# Altium footprint library General.PcbLib: 246 footprints (part 14 of 16)
Each footprint in its own frame and in the unit in brackets; x right, y up, seen from the top. Pads: shape width x height; smd on the part's side, far side on the other; paste and mask are expansions set on the pad; w line width, h text height; cw(c..) or ccw(c..) is an arc to the next point about the centre after c.
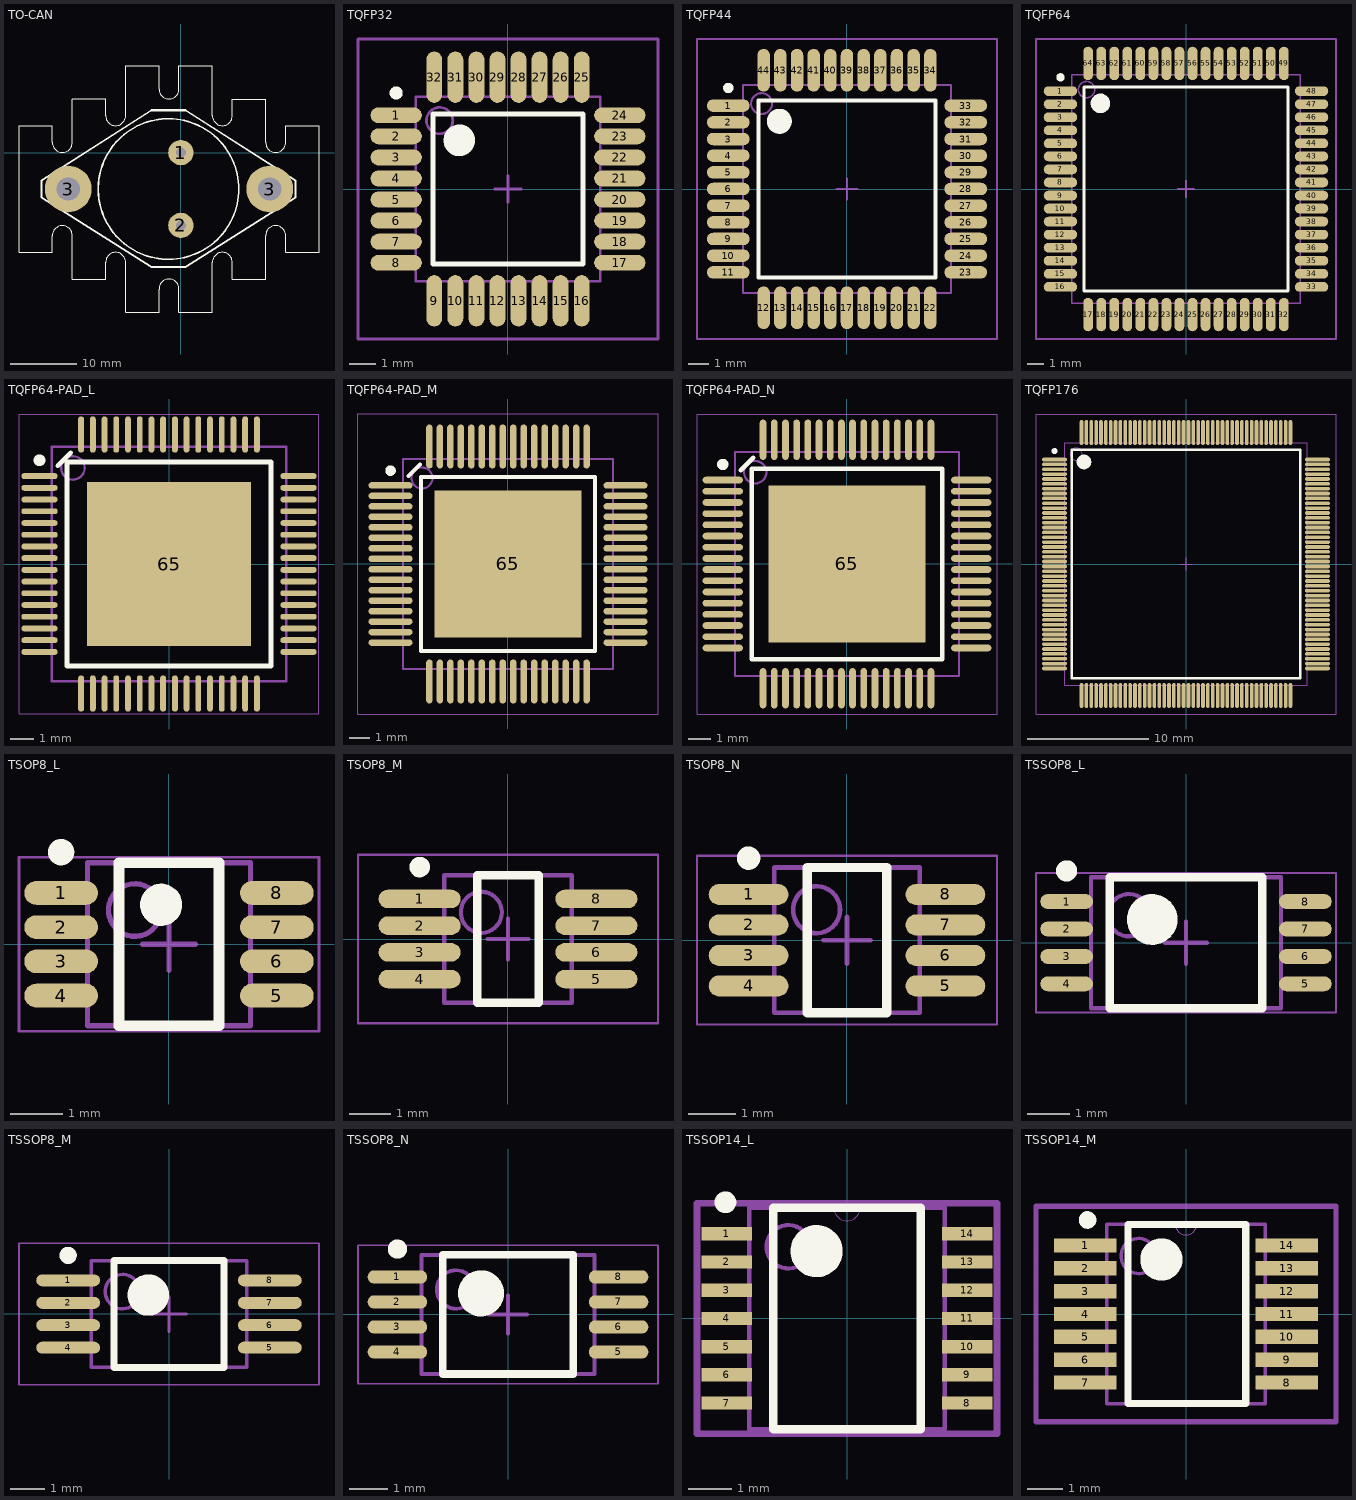
[diagram p13: the footprints below, top view; thin cyan lines are the x and y axes]

## TO-CAN [mm]
pads (4):
  round 3.81 hole 1.5: 1(0,0) 2(0,-10.922)
  round 7 hole 3.5: 3(-16.891,-5.461) 3(13.335,-5.461)
Top Overlay:
  circle w0.254: c-1.854,-5.461 r10.541
  circle w0.254: c-16.891,-5.461 r2.413
  circle w0.254: c13.335,-5.461 r2.413
  lines w0.127: -19.278,-14.961 -24.278,-14.961 -24.278,4.039 -19.279,4.039 -19.279,1.54 ; -19.277,-14.96 -19.277,-12.461 cw(c-17.778,-12.461) -16.279,-12.461 ; -19.277,1.539 ccw(c-17.778,1.539) -16.279,1.539 ; -16.279,8.04 -11.279,8.04 -11.279,5.54 ; -16.278,-12.462 -16.278,-18.961 -11.278,-18.961 ; -16.278,1.539 -16.278,8.039 ; -11.277,-18.96 -11.277,-16.461 cw(c-9.778,-16.461) -8.279,-16.461 ; -11.278,5.539 ccw(c-9.779,5.539) -8.279,5.539 -8.279,13.038 ; -8.278,-16.462 -8.278,-23.961 -3.278,-23.961 ; -8.278,13.039 -3.278,13.039 -3.278,9.539 ccw(c-1.779,9.539) -0.279,9.539 -0.279,13.039 ; -3.277,-23.96 -3.277,-20.461 cw(c-1.778,-20.461) -0.279,-20.461 -0.278,-23.961 4.722,-23.961 ; -0.279,13.04 4.721,13.04 4.721,5.54 ; 4.723,-23.96 4.723,-16.461 cw(c6.222,-16.461) 7.721,-16.461 ; 4.723,5.539 ccw(c6.222,5.539) 7.721,5.539 7.721,8.038 ; 7.722,-16.462 7.722,-18.961 12.722,-18.961 ; 7.722,8.039 12.722,8.039 12.722,1.54 ; 12.723,-18.96 12.723,-12.461 cw(c14.222,-12.461) 15.721,-12.461 15.721,-14.96 ; 12.723,1.539 ccw(c14.222,1.539) 15.721,1.539 15.721,4.038 ; 15.722,-14.961 20.722,-14.961 20.722,4.039 15.722,4.039
  lines w0.305: -20.904,-6.731 -4.394,-17.145 0.686,-17.145 17.196,-6.731 17.196,-4.191 0.686,6.35 -4.394,6.35 -20.904,-4.191 -20.904,-6.731
3D body "User Library-LM317_TO3.STEP": height 8.8, standoff -10.8, extent -21.254,-18.034 17.546,6.966

## TQFP32 [mm] "Thin QFP, 32-Leads, Body 7x7mm, Pitch 0.8mm, IPC Low Density"
height 1.2
pads (32):
  oval 1.95x0.6 smd: 1(-4.25,2.8) 2(-4.25,2) 3(-4.25,1.2) 4(-4.25,0.4) 5(-4.25,-0.4) 6(-4.25,-1.2) 7(-4.25,-2) 8(-4.25,-2.8) 17(4.25,-2.8) 18(4.25,-2) 19(4.25,-1.2) 20(4.25,-0.4) 21(4.25,0.4) 22(4.25,1.2) 23(4.25,2) 24(4.25,2.8)
  oval 0.6x1.95 smd: 9(-2.8,-4.25) 10(-2,-4.25) 11(-1.2,-4.25) 12(-0.4,-4.25) 13(0.4,-4.25) 14(1.2,-4.25) 15(2,-4.25) 16(2.8,-4.25) 25(2.8,4.25) 26(2,4.25) 27(1.2,4.25) 28(0.4,4.25) 29(-0.4,4.25) 30(-1.2,4.25) 31(-2,4.25) 32(-2.8,4.25)
Top Overlay:
  circle w0.6: c-1.85,1.85 r0.3
  circle w0.25: c-4.25,3.65 r0.125
  lines w0.2: -2.85,-2.85 2.85,-2.85 2.85,2.85 -2.85,2.85 -2.85,-2.85
Mechanical 13:
  circle w0.1: c-2.6,2.6 r0.5
  lines w0.1: -3.5,-3.5 3.5,-3.5 3.5,3.5 -3.5,3.5 -3.5,-3.5
Mechanical 15:
  lines w0.1: -0.5,0 0.5,0 ; 0,-0.5 0,0.5 ; -5.7,-5.7 5.7,-5.7 5.7,5.7 -5.7,5.7 -5.7,-5.7
3D body "32.STEP": height 1.2, standoff 0, extent -4.5,-4.5 4.5,4.5

## TQFP44 [mm] "Thin QFP, 44-Leads, Body 10x10mm, Pitch 0.8mm, IPC Low Density"
height 1.2
pads (44):
  oval 2.05x0.6 smd: 1(-5.7,4) 2(-5.7,3.2) 3(-5.7,2.4) 4(-5.7,1.6) 5(-5.7,0.8) 6(-5.7,0) 7(-5.7,-0.8) 8(-5.7,-1.6) 9(-5.7,-2.4) 10(-5.7,-3.2) 11(-5.7,-4) 23(5.7,-4) 24(5.7,-3.2) 25(5.7,-2.4) 26(5.7,-1.6) 27(5.7,-0.8) 28(5.7,0) 29(5.7,0.8) 30(5.7,1.6) 31(5.7,2.4) 32(5.7,3.2) 33(5.7,4)
  oval 0.6x2.05 smd: 12(-4,-5.7) 13(-3.2,-5.7) 14(-2.4,-5.7) 15(-1.6,-5.7) 16(-0.8,-5.7) 17(0,-5.7) 18(0.8,-5.7) 19(1.6,-5.7) 20(2.4,-5.7) 21(3.2,-5.7) 22(4,-5.7) 34(4,5.7) 35(3.2,5.7) 36(2.4,5.7) 37(1.6,5.7) 38(0.8,5.7) 39(0,5.7) 40(-0.8,5.7) 41(-1.6,5.7) 42(-2.4,5.7) 43(-3.2,5.7) 44(-4,5.7)
Top Overlay:
  circle w0.25: c-5.7,4.85 r0.125
  circle w0.6: c-3.25,3.25 r0.3
  lines w0.2: -4.25,-4.25 -4.25,4.25 4.25,4.25 4.25,-4.25 -4.25,-4.25
Mechanical 13:
  circle w0.1: c-4.1,4.1 r0.5
  lines w0.1: -5,-5 -5,5 5,5 5,-5 -5,-5
Mechanical 15:
  lines w0.1: -0.5,0 0.5,0 ; 0,-0.5 0,0.5 ; -7.2,-7.2 -7.2,7.2 7.2,7.2 7.2,-7.2 -7.2,-7.2
3D body "44.STEP": height 1.2, standoff 0, extent -6,-6 6,6

## TQFP64 [mm] "Thin QFP, 64-Leads, Body 14x14mm, Pitch 0.8mm, IPC Low Density"
height 1.2
pads (64):
  oval 2.05x0.6 smd: 1(-7.7,6) 2(-7.7,5.2) 3(-7.7,4.4) 4(-7.7,3.6) 5(-7.7,2.8) 6(-7.7,2) 7(-7.7,1.2) 8(-7.7,0.4) 9(-7.7,-0.4) 10(-7.7,-1.2) 11(-7.7,-2) 12(-7.7,-2.8) 13(-7.7,-3.6) 14(-7.7,-4.4) 15(-7.7,-5.2) 16(-7.7,-6) 33(7.7,-6) 34(7.7,-5.2) 35(7.7,-4.4) 36(7.7,-3.6) 37(7.7,-2.8) 38(7.7,-2) 39(7.7,-1.2) 40(7.7,-0.4) 41(7.7,0.4) 42(7.7,1.2) 43(7.7,2) 44(7.7,2.8) 45(7.7,3.6) 46(7.7,4.4) 47(7.7,5.2) 48(7.7,6)
  oval 0.6x2.05 smd: 17(-6,-7.7) 18(-5.2,-7.7) 19(-4.4,-7.7) 20(-3.6,-7.7) 21(-2.8,-7.7) 22(-2,-7.7) 23(-1.2,-7.7) 24(-0.4,-7.7) 25(0.4,-7.7) 26(1.2,-7.7) 27(2,-7.7) 28(2.8,-7.7) 29(3.6,-7.7) 30(4.4,-7.7) 31(5.2,-7.7) 32(6,-7.7) 49(6,7.7) 50(5.2,7.7) 51(4.4,7.7) 52(3.6,7.7) 53(2.8,7.7) 54(2,7.7) 55(1.2,7.7) 56(0.4,7.7) 57(-0.4,7.7) 58(-1.2,7.7) 59(-2,7.7) 60(-2.8,7.7) 61(-3.6,7.7) 62(-4.4,7.7) 63(-5.2,7.7) 64(-6,7.7)
Top Overlay:
  circle w0.6: c-5.25,5.25 r0.3
  circle w0.25: c-7.7,6.85 r0.125
  lines w0.2: -6.25,-6.25 6.25,-6.25 6.25,6.25 -6.25,6.25 -6.25,-6.25
Mechanical 13:
  circle w0.1: c-6.1,6.1 r0.5
  lines w0.1: -7,-7 7,-7 7,7 -7,7 -7,-7
Mechanical 15:
  lines w0.1: -0.5,0 0.5,0 ; 0,-0.5 0,0.5 ; -9.2,-9.2 9.2,-9.2 9.2,9.2 -9.2,9.2 -9.2,-9.2
3D body "64.STEP": height 1.2, standoff 0, extent -8,-8 8,8

## TQFP64-PAD_L [mm] "QFP, 64-Leads, Body 10x10mm, Pitch 0.5mm, Thermal Pad 7x7mm, IPC High Density"
height 1.2
pads (65):
  oval 1.55x0.25 smd: 1(-5.525,3.75) 2(-5.525,3.25) 3(-5.525,2.75) 4(-5.525,2.25) 5(-5.525,1.75) 6(-5.525,1.25) 7(-5.525,0.75) 8(-5.525,0.25) 9(-5.525,-0.25) 10(-5.525,-0.75) 11(-5.525,-1.25) 12(-5.525,-1.75) 13(-5.525,-2.25) 14(-5.525,-2.75) 15(-5.525,-3.25) 16(-5.525,-3.75) 33(5.525,-3.75) 34(5.525,-3.25) 35(5.525,-2.75) 36(5.525,-2.25) 37(5.525,-1.75) 38(5.525,-1.25) 39(5.525,-0.75) 40(5.525,-0.25) 41(5.525,0.25) 42(5.525,0.75) 43(5.525,1.25) 44(5.525,1.75) 45(5.525,2.25) 46(5.525,2.75) 47(5.525,3.25) 48(5.525,3.75)
  oval 0.25x1.55 smd: 17(-3.75,-5.525) 18(-3.25,-5.525) 19(-2.75,-5.525) 20(-2.25,-5.525) 21(-1.75,-5.525) 22(-1.25,-5.525) 23(-0.75,-5.525) 24(-0.25,-5.525) 25(0.25,-5.525) 26(0.75,-5.525) 27(1.25,-5.525) 28(1.75,-5.525) 29(2.25,-5.525) 30(2.75,-5.525) 31(3.25,-5.525) 32(3.75,-5.525) 49(3.75,5.525) 50(3.25,5.525) 51(2.75,5.525) 52(2.25,5.525) 53(1.75,5.525) 54(1.25,5.525) 55(0.75,5.525) 56(0.25,5.525) 57(-0.25,5.525) 58(-0.75,5.525) 59(-1.25,5.525) 60(-1.75,5.525) 61(-2.25,5.525) 62(-2.75,5.525) 63(-3.25,5.525) 64(-3.75,5.525)
  rect 7x7 smd: 65(0,0)
Top Overlay:
  circle w0.25: c-5.525,4.425 r0.125
  lines w0.2: -4.749,4.191 -4.191,4.749 ; -4.35,-4.35 -4.35,4.35 4.35,4.35 4.35,-4.35 -4.35,-4.35
Mechanical 13:
  circle w0.1: c-4.1,4.1 r0.5
  lines w0.1: -5,-5 -5,5 5,5 5,-5 -5,-5
Mechanical 15:
  lines w0.05: -6.4,-6.4 -6.4,6.4 6.4,6.4 6.4,-6.4 -6.4,-6.4
  lines w0.1: -0.5,0 0.5,0 ; 0,-0.5 0,0.5
3D body "PAP64_7X7-L.stp": height 1.2, standoff 0, extent -6.096,-6.096 6.096,6.096

## TQFP64-PAD_M [mm] "QFP, 64-Leads, Body 10x10mm, Pitch 0.5mm, Thermal Pad 7x7mm, IPC Low Density"
height 1.2
pads (65):
  oval 2.1x0.3 smd: 1(-5.6,3.75) 2(-5.6,3.25) 3(-5.6,2.75) 4(-5.6,2.25) 5(-5.6,1.75) 6(-5.6,1.25) 7(-5.6,0.75) 8(-5.6,0.25) 9(-5.6,-0.25) 10(-5.6,-0.75) 11(-5.6,-1.25) 12(-5.6,-1.75) 13(-5.6,-2.25) 14(-5.6,-2.75) 15(-5.6,-3.25) 16(-5.6,-3.75) 33(5.6,-3.75) 34(5.6,-3.25) 35(5.6,-2.75) 36(5.6,-2.25) 37(5.6,-1.75) 38(5.6,-1.25) 39(5.6,-0.75) 40(5.6,-0.25) 41(5.6,0.25) 42(5.6,0.75) 43(5.6,1.25) 44(5.6,1.75) 45(5.6,2.25) 46(5.6,2.75) 47(5.6,3.25) 48(5.6,3.75)
  oval 0.3x2.1 smd: 17(-3.75,-5.6) 18(-3.25,-5.6) 19(-2.75,-5.6) 20(-2.25,-5.6) 21(-1.75,-5.6) 22(-1.25,-5.6) 23(-0.75,-5.6) 24(-0.25,-5.6) 25(0.25,-5.6) 26(0.75,-5.6) 27(1.25,-5.6) 28(1.75,-5.6) 29(2.25,-5.6) 30(2.75,-5.6) 31(3.25,-5.6) 32(3.75,-5.6) 49(3.75,5.6) 50(3.25,5.6) 51(2.75,5.6) 52(2.25,5.6) 53(1.75,5.6) 54(1.25,5.6) 55(0.75,5.6) 56(0.25,5.6) 57(-0.25,5.6) 58(-0.75,5.6) 59(-1.25,5.6) 60(-1.75,5.6) 61(-2.25,5.6) 62(-2.75,5.6) 63(-3.25,5.6) 64(-3.75,5.6)
  rect 7x7 smd: 65(0,0)
Top Overlay:
  circle w0.25: c-5.6,4.45 r0.125
  lines w0.2: -4.749,4.191 -4.191,4.749 ; -4.15,-4.15 -4.15,4.15 4.15,4.15 4.15,-4.15 -4.15,-4.15
Mechanical 13:
  circle w0.1: c-4.1,4.1 r0.5
  lines w0.1: -5,-5 -5,5 5,5 5,-5 -5,-5
Mechanical 15:
  lines w0.05: -7.15,-7.15 -7.15,7.15 7.15,7.15 7.15,-7.15 -7.15,-7.15
  lines w0.1: -0.5,0 0.5,0 ; 0,-0.5 0,0.5
3D body "PAP64_7X7-L.stp": height 1.2, standoff 0, extent -6.096,-6.096 6.096,6.096

## TQFP64-PAD_N [mm] "QFP, 64-Leads, Body 10x10mm, Pitch 0.5mm, Thermal Pad 7x7mm, IPC Medium Density"
height 1.2
pads (65):
  oval 1.8x0.3 smd: 1(-5.55,3.75) 2(-5.55,3.25) 3(-5.55,2.75) 4(-5.55,2.25) 5(-5.55,1.75) 6(-5.55,1.25) 7(-5.55,0.75) 8(-5.55,0.25) 9(-5.55,-0.25) 10(-5.55,-0.75) 11(-5.55,-1.25) 12(-5.55,-1.75) 13(-5.55,-2.25) 14(-5.55,-2.75) 15(-5.55,-3.25) 16(-5.55,-3.75) 33(5.55,-3.75) 34(5.55,-3.25) 35(5.55,-2.75) 36(5.55,-2.25) 37(5.55,-1.75) 38(5.55,-1.25) 39(5.55,-0.75) 40(5.55,-0.25) 41(5.55,0.25) 42(5.55,0.75) 43(5.55,1.25) 44(5.55,1.75) 45(5.55,2.25) 46(5.55,2.75) 47(5.55,3.25) 48(5.55,3.75)
  oval 0.3x1.8 smd: 17(-3.75,-5.55) 18(-3.25,-5.55) 19(-2.75,-5.55) 20(-2.25,-5.55) 21(-1.75,-5.55) 22(-1.25,-5.55) 23(-0.75,-5.55) 24(-0.25,-5.55) 25(0.25,-5.55) 26(0.75,-5.55) 27(1.25,-5.55) 28(1.75,-5.55) 29(2.25,-5.55) 30(2.75,-5.55) 31(3.25,-5.55) 32(3.75,-5.55) 49(3.75,5.55) 50(3.25,5.55) 51(2.75,5.55) 52(2.25,5.55) 53(1.75,5.55) 54(1.25,5.55) 55(0.75,5.55) 56(0.25,5.55) 57(-0.25,5.55) 58(-0.75,5.55) 59(-1.25,5.55) 60(-1.75,5.55) 61(-2.25,5.55) 62(-2.75,5.55) 63(-3.25,5.55) 64(-3.75,5.55)
  rect 7x7 smd: 65(0,0)
Top Overlay:
  circle w0.25: c-5.55,4.45 r0.125
  lines w0.2: -4.749,4.191 -4.191,4.749 ; -4.25,-4.25 -4.25,4.25 4.25,4.25 4.25,-4.25 -4.25,-4.25
Mechanical 13:
  circle w0.1: c-4.1,4.1 r0.5
  lines w0.1: -5,-5 -5,5 5,5 5,-5 -5,-5
Mechanical 15:
  lines w0.05: -6.7,-6.7 -6.7,6.7 6.7,6.7 6.7,-6.7 -6.7,-6.7
  lines w0.1: -0.5,0 0.5,0 ; 0,-0.5 0,0.5
3D body "PAP64_7X7-L.stp": height 1.2, standoff 0, extent -6.096,-6.096 6.096,6.096

## TQFP176 [mm] "TSQFP, 176-Leads, Body 21.8x21.8mm (max), Pitch 0.40mm, IPC Low Density"
height 1.6
pads (176):
  oval 2.05x0.3 smd: 1(-10.825,8.6) 2(-10.825,8.2) 3(-10.825,7.8) 4(-10.825,7.4) 5(-10.825,7) 6(-10.825,6.6) 7(-10.825,6.2) 8(-10.825,5.8) 9(-10.825,5.4) 10(-10.825,5) 11(-10.825,4.6) 12(-10.825,4.2) 13(-10.825,3.8) 14(-10.825,3.4) 15(-10.825,3) 16(-10.825,2.6) 17(-10.825,2.2) 18(-10.825,1.8) 19(-10.825,1.4) 20(-10.825,1) 21(-10.825,0.6) 22(-10.825,0.2) 23(-10.825,-0.2) 24(-10.825,-0.6) 25(-10.825,-1) 26(-10.825,-1.4) 27(-10.825,-1.8) 28(-10.825,-2.2) 29(-10.825,-2.6) 30(-10.825,-3) 31(-10.825,-3.4) 32(-10.825,-3.8) 33(-10.825,-4.2) 34(-10.825,-4.6) 35(-10.825,-5) 36(-10.825,-5.4) 37(-10.825,-5.8) 38(-10.825,-6.2) 39(-10.825,-6.6) 40(-10.825,-7) 41(-10.825,-7.4) 42(-10.825,-7.8) 43(-10.825,-8.2) 44(-10.825,-8.6) 89(10.825,-8.6) 90(10.825,-8.2) 91(10.825,-7.8) 92(10.825,-7.4) 93(10.825,-7) 94(10.825,-6.6) 95(10.825,-6.2) 96(10.825,-5.8) 97(10.825,-5.4) 98(10.825,-5) 99(10.825,-4.6) 100(10.825,-4.2) 101(10.825,-3.8) 102(10.825,-3.4) 103(10.825,-3) 104(10.825,-2.6) 105(10.825,-2.2) 106(10.825,-1.8) 107(10.825,-1.4) 108(10.825,-1) 109(10.825,-0.6) 110(10.825,-0.2) 111(10.825,0.2) 112(10.825,0.6) 113(10.825,1) 114(10.825,1.4) 115(10.825,1.8) 116(10.825,2.2) 117(10.825,2.6) 118(10.825,3) 119(10.825,3.4) 120(10.825,3.8) 121(10.825,4.2) 122(10.825,4.6) 123(10.825,5) 124(10.825,5.4) 125(10.825,5.8) 126(10.825,6.2) 127(10.825,6.6) 128(10.825,7) 129(10.825,7.4) 130(10.825,7.8) 131(10.825,8.2) 132(10.825,8.6)
  oval 0.3x2.05 smd: 45(-8.6,-10.825) 46(-8.2,-10.825) 47(-7.8,-10.825) 48(-7.4,-10.825) 49(-7,-10.825) 50(-6.6,-10.825) 51(-6.2,-10.825) 52(-5.8,-10.825) 53(-5.4,-10.825) 54(-5,-10.825) 55(-4.6,-10.825) 56(-4.2,-10.825) 57(-3.8,-10.825) 58(-3.4,-10.825) 59(-3,-10.825) 60(-2.6,-10.825) 61(-2.2,-10.825) 62(-1.8,-10.825) 63(-1.4,-10.825) 64(-1,-10.825) 65(-0.6,-10.825) 66(-0.2,-10.825) 67(0.2,-10.825) 68(0.6,-10.825) 69(1,-10.825) 70(1.4,-10.825) 71(1.8,-10.825) 72(2.2,-10.825) 73(2.6,-10.825) 74(3,-10.825) 75(3.4,-10.825) 76(3.8,-10.825) 77(4.2,-10.825) 78(4.6,-10.825) 79(5,-10.825) 80(5.4,-10.825) 81(5.8,-10.825) 82(6.2,-10.825) 83(6.6,-10.825) 84(7,-10.825) 85(7.4,-10.825) 86(7.8,-10.825) 87(8.2,-10.825) 88(8.6,-10.825) 133(8.6,10.825) 134(8.2,10.825) 135(7.8,10.825) 136(7.4,10.825) 137(7,10.825) 138(6.6,10.825) 139(6.2,10.825) 140(5.8,10.825) 141(5.4,10.825) 142(5,10.825) 143(4.6,10.825) 144(4.2,10.825) 145(3.8,10.825) 146(3.4,10.825) 147(3,10.825) 148(2.6,10.825) 149(2.2,10.825) 150(1.8,10.825) 151(1.4,10.825) 152(1,10.825) 153(0.6,10.825) 154(0.2,10.825) 155(-0.2,10.825) 156(-0.6,10.825) 157(-1,10.825) 158(-1.4,10.825) 159(-1.8,10.825) 160(-2.2,10.825) 161(-2.6,10.825) 162(-3,10.825) 163(-3.4,10.825) 164(-3.8,10.825) 165(-4.2,10.825) 166(-4.6,10.825) 167(-5,10.825) 168(-5.4,10.825) 169(-5.8,10.825) 170(-6.2,10.825) 171(-6.6,10.825) 172(-7,10.825) 173(-7.4,10.825) 174(-7.8,10.825) 175(-8.2,10.825) 176(-8.6,10.825)
Top Overlay:
  circle w0.6: c-8.4,8.4 r0.3
  circle w0.25: c-10.825,9.3 r0.125
  lines w0.2: -9.4,-9.4 9.4,-9.4 9.4,9.4 -9.4,9.4 -9.4,-9.4
Mechanical 13:
  circle w0.1: c-9.05,9.05 r0.5
  lines w0.1: -10,-10 10,-10 10,10 -10,10 -10,-10
Mechanical 15:
  lines w0.1: -0.5,0 0.5,0 ; 0,-0.5 0,0.5 ; -12.35,-12.35 12.35,-12.35 12.35,12.35 -12.35,12.35 -12.35,-12.35
3D body "TQFP.STEP": height 1.2, standoff 0, extent -11,-11 11,11

## TSOP8_L [mm] "TSOP, 8-Leads, Body 3x3mm, Pitch 0.65mm, IPC High Density"
height 1.1
pads (8):
  oval 1.4x0.45 smd: 1(-2.05,0.975) 2(-2.05,0.325) 3(-2.05,-0.325) 4(-2.05,-0.975) 5(2.05,-0.975) 6(2.05,-0.325) 7(2.05,0.325) 8(2.05,0.975)
Top Overlay:
  circle w0.4: c-0.15,0.75 r0.2
  circle w0.25: c-2.05,1.75 r0.125
  lines w0.2: -0.95,-1.55 0.95,-1.55 0.95,1.55 -0.95,1.55 -0.95,-1.55
Mechanical 13:
  circle w0.1: c-0.65,0.65 r0.5
  lines w0.1: -1.55,-1.55 1.55,-1.55 1.55,1.55 -1.55,1.55 -1.55,-1.55
Mechanical 15:
  lines w0.05: -2.85,-1.65 2.85,-1.65 2.85,1.65 -2.85,1.65 -2.85,-1.65
  lines w0.1: -0.5,0 0.5,0 ; 0,-0.5 0,0.5
3D body: height 1.1, standoff 0.05, extent -1.55,-1.55 1.55,1.55

## TSOP8_M [mm] "TSOP, 8-Leads, Body 3x3mm, Pitch 0.65mm, IPC Low Density"
height 1.1
pads (8):
  oval 2x0.45 smd: 1(-2.15,0.975) 2(-2.15,0.325) 3(-2.15,-0.325) 4(-2.15,-0.975) 5(2.15,-0.975) 6(2.15,-0.325) 7(2.15,0.325) 8(2.15,0.975)
Top Overlay:
  circle w0.25: c-2.15,1.75 r0.125
  lines w0.2: -0.75,-1.55 -0.75,1.55 0.75,1.55 0.75,-1.55 -0.75,-1.55
Mechanical 13:
  circle w0.1: c-0.65,0.65 r0.5
  lines w0.1: -1.55,-1.55 -1.55,1.55 1.55,1.55 1.55,-1.55 -1.55,-1.55
Mechanical 15:
  lines w0.05: -3.65,-2.05 -3.65,2.05 3.65,2.05 3.65,-2.05 -3.65,-2.05
  lines w0.1: -0.5,0 0.5,0 ; 0,-0.5 0,0.5
3D body: height 1.1, standoff 0.05, extent -1.55,-1.55 1.55,1.55

## TSOP8_N [mm] "TSOP, 8-Leads, Body 3x3mm, Pitch 0.65mm, IPC Medium Density"
height 1.1
pads (8):
  oval 1.7x0.45 smd: 1(-2.1,0.975) 2(-2.1,0.325) 3(-2.1,-0.325) 4(-2.1,-0.975) 5(2.1,-0.975) 6(2.1,-0.325) 7(2.1,0.325) 8(2.1,0.975)
Top Overlay:
  circle w0.25: c-2.1,1.75 r0.125
  lines w0.2: -0.85,-1.55 0.85,-1.55 0.85,1.55 -0.85,1.55 -0.85,-1.55
Mechanical 13:
  circle w0.1: c-0.65,0.65 r0.5
  lines w0.1: -1.55,-1.55 1.55,-1.55 1.55,1.55 -1.55,1.55 -1.55,-1.55
Mechanical 15:
  lines w0.05: -3.2,-1.8 3.2,-1.8 3.2,1.8 -3.2,1.8 -3.2,-1.8
  lines w0.1: -0.5,0 0.5,0 ; 0,-0.5 0,0.5
3D body: height 1.1, standoff 0.05, extent -1.55,-1.55 1.55,1.55

## TSSOP8_L [mm] "TSSOP, 8-Leads, Body 4.4x3mm, Pitch 0.65mm, IPC High Density"
height 1.2
pads (8):
  oval 1.25x0.35 smd: 1(-2.825,0.975) 2(-2.825,0.325) 3(-2.825,-0.325) 4(-2.825,-0.975) 5(2.825,-0.975) 6(2.825,-0.325) 7(2.825,0.325) 8(2.825,0.975)
Top Overlay:
  circle w0.6: c-0.8,0.55 r0.3
  circle w0.25: c-2.825,1.7 r0.125
  lines w0.2: -1.8,-1.55 1.8,-1.55 1.8,1.55 -1.8,1.55 -1.8,-1.55
Mechanical 13:
  circle w0.1: c-1.35,0.65 r0.5
  lines w0.1: -2.25,-1.55 2.25,-1.55 2.25,1.55 -2.25,1.55 -2.25,-1.55
Mechanical 15:
  lines w0.05: -3.55,-1.65 3.55,-1.65 3.55,1.65 -3.55,1.65 -3.55,-1.65
  lines w0.1: -0.5,0 0.5,0 ; 0,-0.5 0,0.5
3D body "User Library-TSSOP-8.STEP": height 1.2, standoff 0, extent -3.2,-1.5 3.2,1.5

## TSSOP8_M [mm] "TSSOP, 8-Leads, Body 4.4x3mm, Pitch 0.65mm, IPC Low Density"
height 1.2
pads (8):
  oval 1.85x0.35 smd: 1(-2.925,0.975) 2(-2.925,0.325) 3(-2.925,-0.325) 4(-2.925,-0.975) 5(2.925,-0.975) 6(2.925,-0.325) 7(2.925,0.325) 8(2.925,0.975)
Top Overlay:
  circle w0.25: c-2.925,1.7 r0.125
  circle w0.6: c-0.6,0.55 r0.3
  lines w0.2: -1.6,-1.55 -1.6,1.55 1.6,1.55 1.6,-1.55 -1.6,-1.55
Mechanical 13:
  circle w0.1: c-1.35,0.65 r0.5
  lines w0.1: -2.25,-1.55 -2.25,1.55 2.25,1.55 2.25,-1.55 -2.25,-1.55
Mechanical 15:
  lines w0.05: -4.35,-2.05 -4.35,2.05 4.35,2.05 4.35,-2.05 -4.35,-2.05
  lines w0.1: -0.5,0 0.5,0 ; 0,-0.5 0,0.5
3D body "User Library-TSSOP-8.STEP": height 1.2, standoff 0, extent -3.2,-1.5 3.2,1.5

## TSSOP8_N [mm] "TSSOP, 8-Leads, Body 4.4x3mm, Pitch 0.65mm, IPC Medium Density"
height 1.2
pads (8):
  oval 1.55x0.35 smd: 1(-2.875,0.975) 2(-2.875,0.325) 3(-2.875,-0.325) 4(-2.875,-0.975) 5(2.875,-0.975) 6(2.875,-0.325) 7(2.875,0.325) 8(2.875,0.975)
Top Overlay:
  circle w0.6: c-0.7,0.55 r0.3
  circle w0.25: c-2.875,1.7 r0.125
  lines w0.2: -1.7,-1.55 1.7,-1.55 1.7,1.55 -1.7,1.55 -1.7,-1.55
Mechanical 13:
  circle w0.1: c-1.35,0.65 r0.5
  lines w0.1: -2.25,-1.55 2.25,-1.55 2.25,1.55 -2.25,1.55 -2.25,-1.55
Mechanical 15:
  lines w0.05: -3.9,-1.8 3.9,-1.8 3.9,1.8 -3.9,1.8 -3.9,-1.8
  lines w0.1: -0.5,0 0.5,0 ; 0,-0.5 0,0.5
3D body "User Library-TSSOP-8.STEP": height 1.2, standoff 0, extent -3.2,-1.5 3.2,1.5

## TSSOP14_L [mil]
pads (14):
  rect 46x12 smd: 1(-109,76.77) 2(-109,51.18) 3(-109,25.59) 4(-109,0) 5(-109,-25.59) 6(-109,-51.18) 7(-109,-76.77) 8(109,-76.77) 9(109,-51.18) 10(109,-25.59) 11(109,0) 12(109,25.59) 13(109,51.18) 14(109,76.77)
Top Overlay:
  circle w9.84: c-110.24,105.31 r4.92
  circle w23.62: c-27.56,61.02 r11.81
  lines w7.87: -66.93,-100.39 -66.93,100.39 66.93,100.39 66.93,-100.39 -66.93,-100.39
Mechanical 13:
  circle w3.94: c-53.15,64.96 r19.68
  lines w0: -12,100.5 ccw(c0,100.5) 12,100.5
  lines w3.94: -88.58,-100.39 88.58,-100.39 88.58,100.39 -88.58,100.39 -88.58,-100.39
Mechanical 15:
  lines w6: -136,-104.5 136,-104.5 136,104.5 -136,104.5 -136,-104.5
3D body "RU_14-L.stp": height 47.1, standoff 0, extent -126,-100.5 126,100.5

## TSSOP14_M [mil]
pads (14):
  rect 70x16 smd mask+4: 1(-113,76.77) 2(-113,51.18) 3(-113,25.59) 4(-113,0) 5(-113,-25.59) 6(-113,-51.18) 7(-113,-76.77) 8(113,-76.77) 9(113,-51.18) 10(113,-25.59) 11(113,0) 12(113,25.59) 13(113,51.18) 14(113,76.77)
Top Overlay:
  circle w9.84: c-110.24,105.31 r4.92
  circle w23.62: c-27.56,61.02 r11.81
  lines w7.87: -65,-100.39 -65,100.39 66.93,100.39 66.93,-100.39 -65,-100.39
Mechanical 13:
  circle w3.94: c-53.15,64.96 r19.68
  lines w0: -12,100.5 ccw(c0,100.5) 12,100.5
  lines w3.94: -88.58,-100.39 -88.58,100.39 88.58,100.39 88.58,-100.39 -88.58,-100.39
Mechanical 15:
  lines w6: -168,-120.5 168,-120.5 168,120.5 -168,120.5 -168,-120.5
3D body "RU_14-M.stp": height 47.1, standoff 0, extent -126,-100.5 126,100.5